# Altium footprint library TarabusLibrary.PcbLib: 591 footprints (part 29 of 37)
Each footprint in its own frame and in the unit in brackets; x right, y up, seen from the top. Pads: shape width x height; smd on the part's side, far side on the other; paste and mask are expansions set on the pad; w line width, h text height; cw(c..) or ccw(c..) is an arc to the next point about the centre after c.
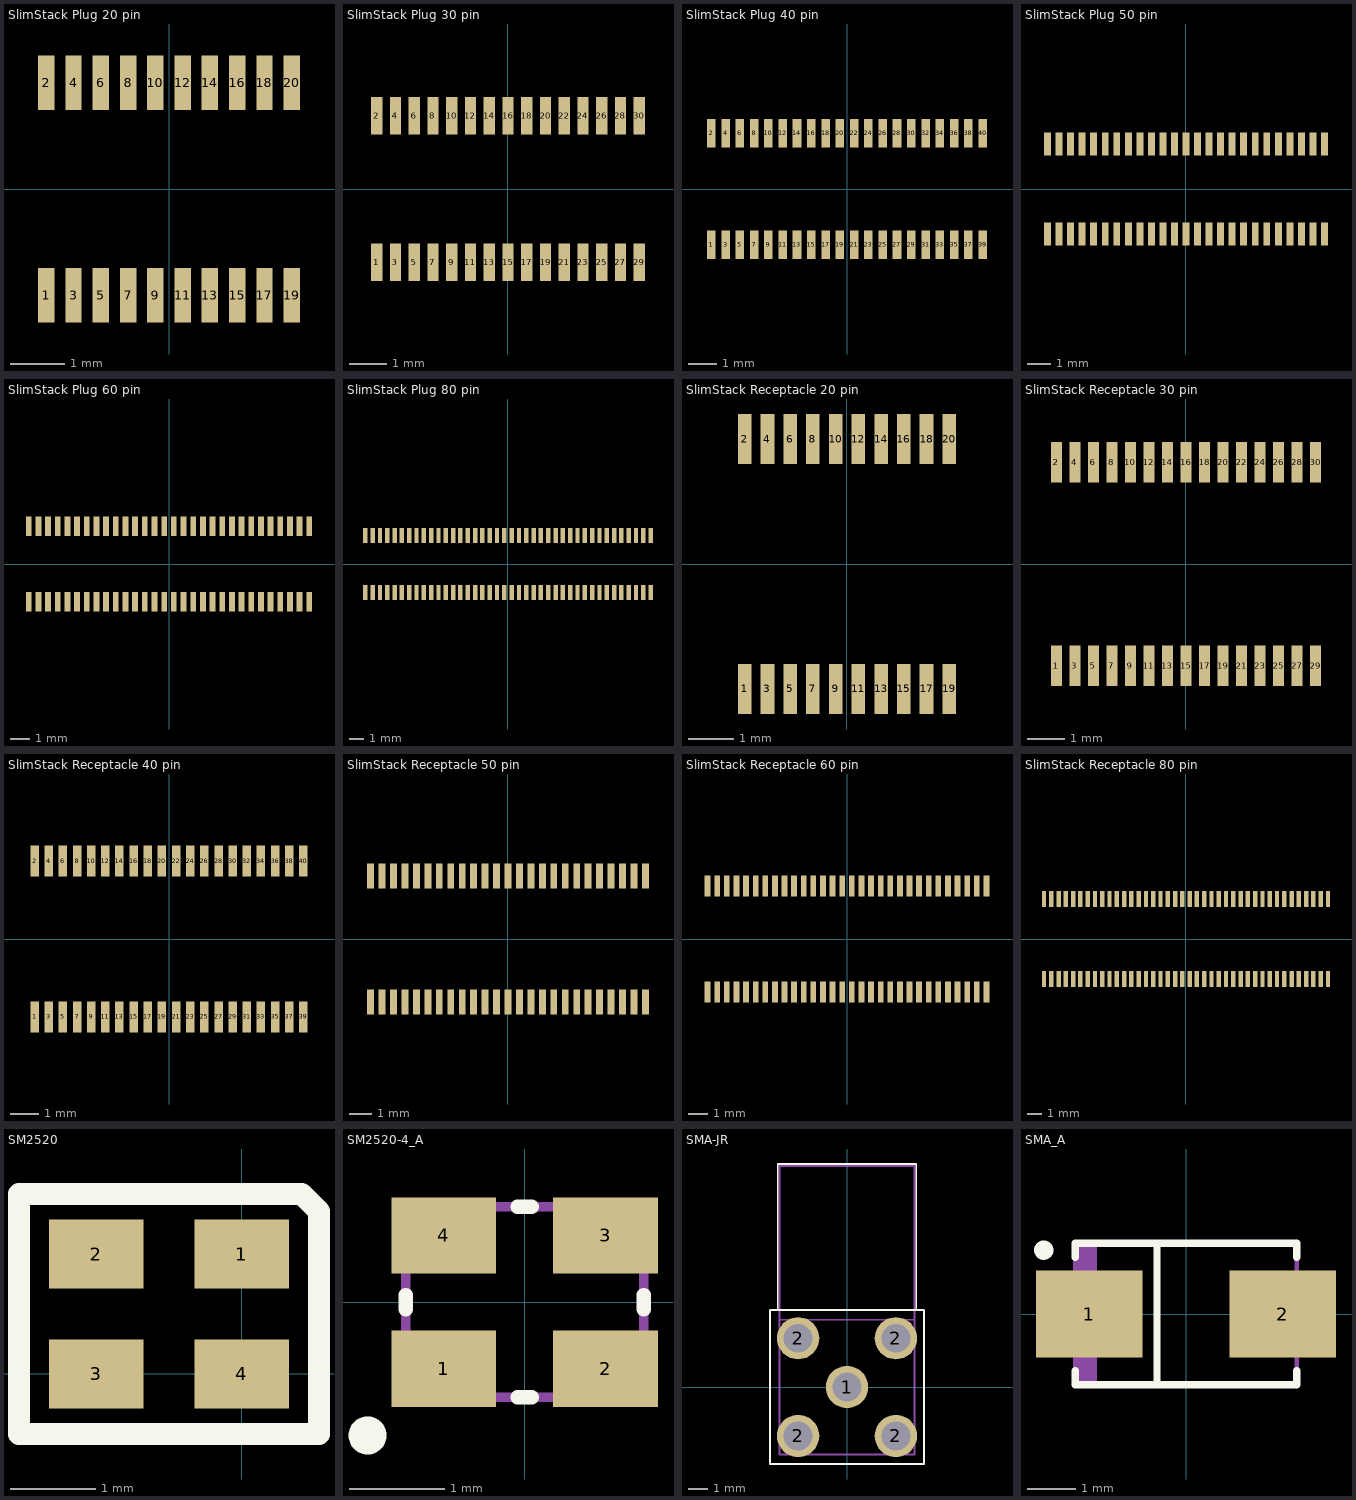
[diagram p28: the footprints below, top view; thin cyan lines are the x and y axes]

## SlimStack Plug 20 pin [mm] "SlimStack™ 0.50mm Pitch Board-to-Board Connectors, Molex, 20 pin"
height 1.2
pads (20):
  rect 0.3x1 smd: 1(-2.25,-1.95) 2(-2.25,1.95) 3(-1.75,-1.95) 4(-1.75,1.95) 5(-1.25,-1.95) 6(-1.25,1.95) 7(-0.75,-1.95) 8(-0.75,1.95) 9(-0.25,-1.95) 10(-0.25,1.95) 11(0.25,-1.95) 12(0.25,1.95) 13(0.75,-1.95) 14(0.75,1.95) 15(1.25,-1.95) 16(1.25,1.95) 17(1.75,-1.95) 18(1.75,1.95) 19(2.25,-1.95) 20(2.25,1.95)
3D body "555600207.stp": height 1.17, standoff -0.03, extent -3.225,-2.2 3.225,2.1

## SlimStack Plug 30 pin [mm] "SlimStack™ 0.50mm Pitch Board-to-Board Connectors, Molex, 30 pin"
height 1.2
pads (30):
  rect 0.3x1 smd: 1(-3.5,-1.95) 2(-3.5,1.95) 3(-3,-1.95) 4(-3,1.95) 5(-2.5,-1.95) 6(-2.5,1.95) 7(-2,-1.95) 8(-2,1.95) 9(-1.5,-1.95) 10(-1.5,1.95) 11(-1,-1.95) 12(-1,1.95) 13(-0.5,-1.95) 14(-0.5,1.95) 15(0,-1.95) 16(0,1.95) 17(0.5,-1.95) 18(0.5,1.95) 19(1,-1.95) 20(1,1.95) 21(1.5,-1.95) 22(1.5,1.95) 23(2,-1.95) 24(2,1.95) 25(2.5,-1.95) 26(2.5,1.95) 27(3,-1.95) 28(3,1.95) 29(3.5,-1.95) 30(3.5,1.95)
3D body "555600307.stp": height 1.17, standoff -0.03, extent -4.475,-2.15 4.475,2.15

## SlimStack Plug 40 pin [mm] "SlimStack™ 0.50mm Pitch Board-to-Board Connectors, Molex, 40 pin"
height 1.2
pads (40):
  rect 0.3x1 smd: 1(-4.75,-1.95) 2(-4.75,1.95) 3(-4.25,-1.95) 4(-4.25,1.95) 5(-3.75,-1.95) 6(-3.75,1.95) 7(-3.25,-1.95) 8(-3.25,1.95) 9(-2.75,-1.95) 10(-2.75,1.95) 11(-2.25,-1.95) 12(-2.25,1.95) 13(-1.75,-1.95) 14(-1.75,1.95) 15(-1.25,-1.95) 16(-1.25,1.95) 17(-0.75,-1.95) 18(-0.75,1.95) 19(-0.25,-1.95) 20(-0.25,1.95) 21(0.25,-1.95) 22(0.25,1.95) 23(0.75,-1.95) 24(0.75,1.95) 25(1.25,-1.95) 26(1.25,1.95) 27(1.75,-1.95) 28(1.75,1.95) 29(2.25,-1.95) 30(2.25,1.95) 31(2.75,-1.95) 32(2.75,1.95) 33(3.25,-1.95) 34(3.25,1.95) 35(3.75,-1.95) 36(3.75,1.95) 37(4.25,-1.95) 38(4.25,1.95) 39(4.75,-1.95) 40(4.75,1.95)
3D body "555600407.stp": height 1.17, standoff -0.03, extent -5.725,-2.15 5.725,2.15

## SlimStack Plug 50 pin [mm] "SlimStack™ 0.50mm Pitch Board-to-Board Connectors, Molex, 50 pin"
height 1.2
pads (50):
  rect 0.3x1 smd: 1(-6,-1.95) 2(-6,1.95) 3(-5.5,-1.95) 4(-5.5,1.95) 5(-5,-1.95) 6(-5,1.95) 7(-4.5,-1.95) 8(-4.5,1.95) 9(-4,-1.95) 10(-4,1.95) 11(-3.5,-1.95) 12(-3.5,1.95) 13(-3,-1.95) 14(-3,1.95) 15(-2.5,-1.95) 16(-2.5,1.95) 17(-2,-1.95) 18(-2,1.95) 19(-1.5,-1.95) 20(-1.5,1.95) 21(-1,-1.95) 22(-1,1.95) 23(-0.5,-1.95) 24(-0.5,1.95) 25(0,-1.95) 26(0,1.95) 27(0.5,-1.95) 28(0.5,1.95) 29(1,-1.95) 30(1,1.95) 31(1.5,-1.95) 32(1.5,1.95) 33(2,-1.95) 34(2,1.95) 35(2.5,-1.95) 36(2.5,1.95) 37(3,-1.95) 38(3,1.95) 39(3.5,-1.95) 40(3.5,1.95) 41(4,-1.95) 42(4,1.95) 43(4.5,-1.95) 44(4.5,1.95) 45(5,-1.95) 46(5,1.95) 47(5.5,-1.95) 48(5.5,1.95) 49(6,-1.95) 50(6,1.95)
3D body "555600507.stp": height 1.17, standoff -0.03, extent -6.975,-2.15 6.975,2.15

## SlimStack Plug 60 pin [mm] "SlimStack™ 0.50mm Pitch Board-to-Board Connectors, Molex, 60 pin"
height 1.2
pads (60):
  rect 0.3x1 smd: 1(-7.25,-1.95) 2(-7.25,1.95) 3(-6.75,-1.95) 4(-6.75,1.95) 5(-6.25,-1.95) 6(-6.25,1.95) 7(-5.75,-1.95) 8(-5.75,1.95) 9(-5.25,-1.95) 10(-5.25,1.95) 11(-4.75,-1.95) 12(-4.75,1.95) 13(-4.25,-1.95) 14(-4.25,1.95) 15(-3.75,-1.95) 16(-3.75,1.95) 17(-3.25,-1.95) 18(-3.25,1.95) 19(-2.75,-1.95) 20(-2.75,1.95) 21(-2.25,-1.95) 22(-2.25,1.95) 23(-1.75,-1.95) 24(-1.75,1.95) 25(-1.25,-1.95) 26(-1.25,1.95) 27(-0.75,-1.95) 28(-0.75,1.95) 29(-0.25,-1.95) 30(-0.25,1.95) 31(0.25,-1.95) 32(0.25,1.95) 33(0.75,-1.95) 34(0.75,1.95) 35(1.25,-1.95) 36(1.25,1.95) 37(1.75,-1.95) 38(1.75,1.95) 39(2.25,-1.95) 40(2.25,1.95) 41(2.75,-1.95) 42(2.75,1.95) 43(3.25,-1.95) 44(3.25,1.95) 45(3.75,-1.95) 46(3.75,1.95) 47(4.25,-1.95) 48(4.25,1.95) 49(4.75,-1.95) 50(4.75,1.95) 51(5.25,-1.95) 52(5.25,1.95) 53(5.75,-1.95) 54(5.75,1.95) 55(6.25,-1.95) 56(6.25,1.95) 57(6.75,-1.95) 58(6.75,1.95) 59(7.25,-1.95) 60(7.25,1.95)
3D body "555600607.stp": height 1.17, standoff -0.03, extent -8.225,-2.15 8.225,2.15

## SlimStack Plug 80 pin [mm] "SlimStack™ 0.50mm Pitch Board-to-Board Connectors, Molex, 80 pin"
height 1.2
pads (80):
  rect 0.3x1 smd: 1(-9.75,-1.95) 2(-9.75,1.95) 3(-9.25,-1.95) 4(-9.25,1.95) 5(-8.75,-1.95) 6(-8.75,1.95) 7(-8.25,-1.95) 8(-8.25,1.95) 9(-7.75,-1.95) 10(-7.75,1.95) 11(-7.25,-1.95) 12(-7.25,1.95) 13(-6.75,-1.95) 14(-6.75,1.95) 15(-6.25,-1.95) 16(-6.25,1.95) 17(-5.75,-1.95) 18(-5.75,1.95) 19(-5.25,-1.95) 20(-5.25,1.95) 21(-4.75,-1.95) 22(-4.75,1.95) 23(-4.25,-1.95) 24(-4.25,1.95) 25(-3.75,-1.95) 26(-3.75,1.95) 27(-3.25,-1.95) 28(-3.25,1.95) 29(-2.75,-1.95) 30(-2.75,1.95) 31(-2.25,-1.95) 32(-2.25,1.95) 33(-1.75,-1.95) 34(-1.75,1.95) 35(-1.25,-1.95) 36(-1.25,1.95) 37(-0.75,-1.95) 38(-0.75,1.95) 39(-0.25,-1.95) 40(-0.25,1.95) 41(0.25,-1.95) 42(0.25,1.95) 43(0.75,-1.95) 44(0.75,1.95) 45(1.25,-1.95) 46(1.25,1.95) 47(1.75,-1.95) 48(1.75,1.95) 49(2.25,-1.95) 50(2.25,1.95) 51(2.75,-1.95) 52(2.75,1.95) 53(3.25,-1.95) 54(3.25,1.95) 55(3.75,-1.95) 56(3.75,1.95) 57(4.25,-1.95) 58(4.25,1.95) 59(4.75,-1.95) 60(4.75,1.95) 61(5.25,-1.95) 62(5.25,1.95) 63(5.75,-1.95) 64(5.75,1.95) 65(6.25,-1.95) 66(6.25,1.95) 67(6.75,-1.95) 68(6.75,1.95) 69(7.25,-1.95) 70(7.25,1.95) 71(7.75,-1.95) 72(7.75,1.95) 73(8.25,-1.95) 74(8.25,1.95) 75(8.75,-1.95) 76(8.75,1.95) 77(9.25,-1.95) 78(9.25,1.95) 79(9.75,-1.95) 80(9.75,1.95)
3D body "555600807.stp": height 1.17, standoff -0.03, extent -10.725,-2.15 10.725,2.15

## SlimStack Receptacle 20 pin [mm] "SlimStack™ 0.50mm Pitch Board-to-Board Connectors, Molex, 20 pin"
height 1.2
pads (20):
  rect 0.3x1.1 smd: 1(-2.25,-2.75) 2(-2.25,2.75) 3(-1.75,-2.75) 4(-1.75,2.75) 5(-1.25,-2.75) 6(-1.25,2.75) 7(-0.75,-2.75) 8(-0.75,2.75) 9(-0.25,-2.75) 10(-0.25,2.75) 11(0.25,-2.75) 12(0.25,2.75) 13(0.75,-2.75) 14(0.75,2.75) 15(1.25,-2.75) 16(1.25,2.75) 17(1.75,-2.75) 18(1.75,2.75) 19(2.25,-2.75) 20(2.25,2.75)
3D body "547220204.stp": height 1.17, standoff -0.03, extent -3.8,-3 3.8,3

## SlimStack Receptacle 30 pin [mm] "SlimStack™ 0.50mm Pitch Board-to-Board Connectors, Molex, 30 pin"
height 1.2
pads (30):
  rect 0.3x1.1 smd: 1(-3.5,-2.75) 2(-3.5,2.75) 3(-3,-2.75) 4(-3,2.75) 5(-2.5,-2.75) 6(-2.5,2.75) 7(-2,-2.75) 8(-2,2.75) 9(-1.5,-2.75) 10(-1.5,2.75) 11(-1,-2.75) 12(-1,2.75) 13(-0.5,-2.75) 14(-0.5,2.75) 15(0,-2.75) 16(0,2.75) 17(0.5,-2.75) 18(0.5,2.75) 19(1,-2.75) 20(1,2.75) 21(1.5,-2.75) 22(1.5,2.75) 23(2,-2.75) 24(2,2.75) 25(2.5,-2.75) 26(2.5,2.75) 27(3,-2.75) 28(3,2.75) 29(3.5,-2.75) 30(3.5,2.75)
3D body "547220304.stp": height 1.17, standoff -0.03, extent -5.05,-3 5.05,3

## SlimStack Receptacle 40 pin [mm] "SlimStack™ 0.50mm Pitch Board-to-Board Connectors, Molex, 40 pin"
height 1.2
pads (40):
  rect 0.3x1.1 smd: 1(-4.75,-2.75) 2(-4.75,2.75) 3(-4.25,-2.75) 4(-4.25,2.75) 5(-3.75,-2.75) 6(-3.75,2.75) 7(-3.25,-2.75) 8(-3.25,2.75) 9(-2.75,-2.75) 10(-2.75,2.75) 11(-2.25,-2.75) 12(-2.25,2.75) 13(-1.75,-2.75) 14(-1.75,2.75) 15(-1.25,-2.75) 16(-1.25,2.75) 17(-0.75,-2.75) 18(-0.75,2.75) 19(-0.25,-2.75) 20(-0.25,2.75) 21(0.25,-2.75) 22(0.25,2.75) 23(0.75,-2.75) 24(0.75,2.75) 25(1.25,-2.75) 26(1.25,2.75) 27(1.75,-2.75) 28(1.75,2.75) 29(2.25,-2.75) 30(2.25,2.75) 31(2.75,-2.75) 32(2.75,2.75) 33(3.25,-2.75) 34(3.25,2.75) 35(3.75,-2.75) 36(3.75,2.75) 37(4.25,-2.75) 38(4.25,2.75) 39(4.75,-2.75) 40(4.75,2.75)
3D body "547220404.stp": height 1.17, standoff -0.03, extent -6.3,-3 6.3,3

## SlimStack Receptacle 50 pin [mm] "SlimStack™ 0.50mm Pitch Board-to-Board Connectors, Molex, 50 pin"
height 1.2
pads (50):
  rect 0.3x1.1 smd: 1(-6,-2.75) 2(-6,2.75) 3(-5.5,-2.75) 4(-5.5,2.75) 5(-5,-2.75) 6(-5,2.75) 7(-4.5,-2.75) 8(-4.5,2.75) 9(-4,-2.75) 10(-4,2.75) 11(-3.5,-2.75) 12(-3.5,2.75) 13(-3,-2.75) 14(-3,2.75) 15(-2.5,-2.75) 16(-2.5,2.75) 17(-2,-2.75) 18(-2,2.75) 19(-1.5,-2.75) 20(-1.5,2.75) 21(-1,-2.75) 22(-1,2.75) 23(-0.5,-2.75) 24(-0.5,2.75) 25(0,-2.75) 26(0,2.75) 27(0.5,-2.75) 28(0.5,2.75) 29(1,-2.75) 30(1,2.75) 31(1.5,-2.75) 32(1.5,2.75) 33(2,-2.75) 34(2,2.75) 35(2.5,-2.75) 36(2.5,2.75) 37(3,-2.75) 38(3,2.75) 39(3.5,-2.75) 40(3.5,2.75) 41(4,-2.75) 42(4,2.75) 43(4.5,-2.75) 44(4.5,2.75) 45(5,-2.75) 46(5,2.75) 47(5.5,-2.75) 48(5.5,2.75) 49(6,-2.75) 50(6,2.75)
3D body "547220504.stp": height 1.17, standoff -0.03, extent -7.55,-3 7.55,3

## SlimStack Receptacle 60 pin [mm] "SlimStack™ 0.50mm Pitch Board-to-Board Connectors, Molex, 60 pin"
height 1.2
pads (60):
  rect 0.3x1.1 smd: 1(-7.25,-2.75) 2(-7.25,2.75) 3(-6.75,-2.75) 4(-6.75,2.75) 5(-6.25,-2.75) 6(-6.25,2.75) 7(-5.75,-2.75) 8(-5.75,2.75) 9(-5.25,-2.75) 10(-5.25,2.75) 11(-4.75,-2.75) 12(-4.75,2.75) 13(-4.25,-2.75) 14(-4.25,2.75) 15(-3.75,-2.75) 16(-3.75,2.75) 17(-3.25,-2.75) 18(-3.25,2.75) 19(-2.75,-2.75) 20(-2.75,2.75) 21(-2.25,-2.75) 22(-2.25,2.75) 23(-1.75,-2.75) 24(-1.75,2.75) 25(-1.25,-2.75) 26(-1.25,2.75) 27(-0.75,-2.75) 28(-0.75,2.75) 29(-0.25,-2.75) 30(-0.25,2.75) 31(0.25,-2.75) 32(0.25,2.75) 33(0.75,-2.75) 34(0.75,2.75) 35(1.25,-2.75) 36(1.25,2.75) 37(1.75,-2.75) 38(1.75,2.75) 39(2.25,-2.75) 40(2.25,2.75) 41(2.75,-2.75) 42(2.75,2.75) 43(3.25,-2.75) 44(3.25,2.75) 45(3.75,-2.75) 46(3.75,2.75) 47(4.25,-2.75) 48(4.25,2.75) 49(4.75,-2.75) 50(4.75,2.75) 51(5.25,-2.75) 52(5.25,2.75) 53(5.75,-2.75) 54(5.75,2.75) 55(6.25,-2.75) 56(6.25,2.75) 57(6.75,-2.75) 58(6.75,2.75) 59(7.25,-2.75) 60(7.25,2.75)
3D body "547220604.stp": height 1.17, standoff -0.03, extent -8.8,-3 8.8,3

## SlimStack Receptacle 80 pin [mm] "SlimStack™ 0.50mm Pitch Board-to-Board Connectors, Molex, 80 pin"
height 1.2
pads (80):
  rect 0.3x1.1 smd: 1(-9.75,-2.75) 2(-9.75,2.75) 3(-9.25,-2.75) 4(-9.25,2.75) 5(-8.75,-2.75) 6(-8.75,2.75) 7(-8.25,-2.75) 8(-8.25,2.75) 9(-7.75,-2.75) 10(-7.75,2.75) 11(-7.25,-2.75) 12(-7.25,2.75) 13(-6.75,-2.75) 14(-6.75,2.75) 15(-6.25,-2.75) 16(-6.25,2.75) 17(-5.75,-2.75) 18(-5.75,2.75) 19(-5.25,-2.75) 20(-5.25,2.75) 21(-4.75,-2.75) 22(-4.75,2.75) 23(-4.25,-2.75) 24(-4.25,2.75) 25(-3.75,-2.75) 26(-3.75,2.75) 27(-3.25,-2.75) 28(-3.25,2.75) 29(-2.75,-2.75) 30(-2.75,2.75) 31(-2.25,-2.75) 32(-2.25,2.75) 33(-1.75,-2.75) 34(-1.75,2.75) 35(-1.25,-2.75) 36(-1.25,2.75) 37(-0.75,-2.75) 38(-0.75,2.75) 39(-0.25,-2.75) 40(-0.25,2.75) 41(0.25,-2.75) 42(0.25,2.75) 43(0.75,-2.75) 44(0.75,2.75) 45(1.25,-2.75) 46(1.25,2.75) 47(1.75,-2.75) 48(1.75,2.75) 49(2.25,-2.75) 50(2.25,2.75) 51(2.75,-2.75) 52(2.75,2.75) 53(3.25,-2.75) 54(3.25,2.75) 55(3.75,-2.75) 56(3.75,2.75) 57(4.25,-2.75) 58(4.25,2.75) 59(4.75,-2.75) 60(4.75,2.75) 61(5.25,-2.75) 62(5.25,2.75) 63(5.75,-2.75) 64(5.75,2.75) 65(6.25,-2.75) 66(6.25,2.75) 67(6.75,-2.75) 68(6.75,2.75) 69(7.25,-2.75) 70(7.25,2.75) 71(7.75,-2.75) 72(7.75,2.75) 73(8.25,-2.75) 74(8.25,2.75) 75(8.75,-2.75) 76(8.75,2.75) 77(9.25,-2.75) 78(9.25,2.75) 79(9.75,-2.75) 80(9.75,2.75)
3D body "547220804.stp": height 1.17, standoff -0.03, extent -11.3,-3 11.3,3

## SM2520 [mm]
pads (4):
  rect 1.1x0.8 smd: 1(0,1.4) 2(-1.7,1.4) 3(-1.7,0) 4(0,0)
Top Overlay:
  lines w0.254: -2.6,-0.7 -2.6,2.1 0.7,2.1 0.9,1.9 0.9,-0.7 -2.6,-0.7
3D body: height 1, standoff 0, extent -2.6,-0.7 0.9,2.1

## SM2520-4_A [mm]
height 1
pads (4):
  rect 1.1x0.8 smd: 1(-0.85,-0.7) 2(0.85,-0.7) 3(0.85,0.7) 4(-0.85,0.7)
Top Overlay:
  circle w0.2: c-1.65,-1.4 r0.1
  lines w0.15: -1.25,-0.075 -1.25,0.075 ; -0.075,-1 0.075,-1 ; -0.075,1 0.075,1 ; 1.25,-0.075 1.25,0.075
Mechanical 7:
  lines w0.1: -1.25,-1 1.25,-1 1.25,1 -1.25,1 -1.25,-1
Mechanical 10:
  text ".Comment" at -1,-1.725 h0.6
  text ".Designator" at -0.775,1.6 h0.8
3D body: height 1, standoff 0, extent -1.25,-1 1.25,1

## SMA-JR [mm]
pads (5):
  round 2.2 hole 1.5: 1(0,0) 2(-2.54,-2.54) 2(-2.54,2.54) 2(2.54,-2.54) 2(2.54,2.54)
Top Overlay:
  lines w0.1: -3.6,4 -3.6,11.6 3.6,11.6 3.6,4 ; -4,-4 -4,4 4,4 4,-4 -4,-4
Mechanical 7:
  lines w0.1: -3.5,3.5 -3.5,-3.5 3.5,-3.5 3.5,3.5 ; -3.5,3.5 3.5,3.5 ; -3.5,3.5 -3.5,11.5 3.5,11.5 3.5,3.5
Mechanical 10:
  text ".Designator" at -1.35,5.1 h0.8
  text ".Comment" at -0.875,4.45 h0.6
3D body: height 9.49, standoff 2.51, extent -3.472,3.5 3.5,11.5
3D body: height 10, standoff 0.1, extent -3.5,-3.5 3.5,3.5

## SMA_A [mm]
height 2.67
pads (2):
  rect 2.2x1.8 smd: 1(-2,0) 2(2,0)
Top Overlay:
  circle w0.2: c-2.94,1.32 r0.1
  lines w0.15: -2.29,-1.17 -2.29,-1.46 2.29,-1.46 2.29,-1.17 ; -2.29,1.17 -2.29,1.46 2.29,1.46 2.29,1.17 ; -0.6,-1.45 -0.6,1.45
Mechanical 7:
  lines w0.1: -2.29,-0.82 -2.8,-0.82 -2.8,0.82 -2.29,0.82 ; -2.19,-1.44 -2.19,1.46 ; -2.09,-1.44 -2.09,1.46 ; -1.99,-1.44 -1.99,1.46 ; -1.89,-1.44 -1.89,1.46 ; 2.29,-0.82 2.8,-0.82 2.8,0.82 2.29,0.82 ; -2.29,-1.46 -2.29,1.46 2.29,1.46 2.29,-1.46 -2.29,-1.46
Mechanical 10:
  text ".Comment" at -0.88,-2.11 h0.6
  text ".Designator" at -1.12,1.81 h0.8
3D body: height 2, standoff 0, extent 2.29,-0.82 2.8,0.82
3D body: height 2, standoff 0, extent -2.8,-0.82 -2.29,0.82
3D body: height 2.87, standoff 0, extent -2.29,-1.46 2.29,1.46